# Altium schematic symbol library AliPadash.SchLib: 1186 symbols (part 2 of 6) (continued)
## DDP3315C (continued)
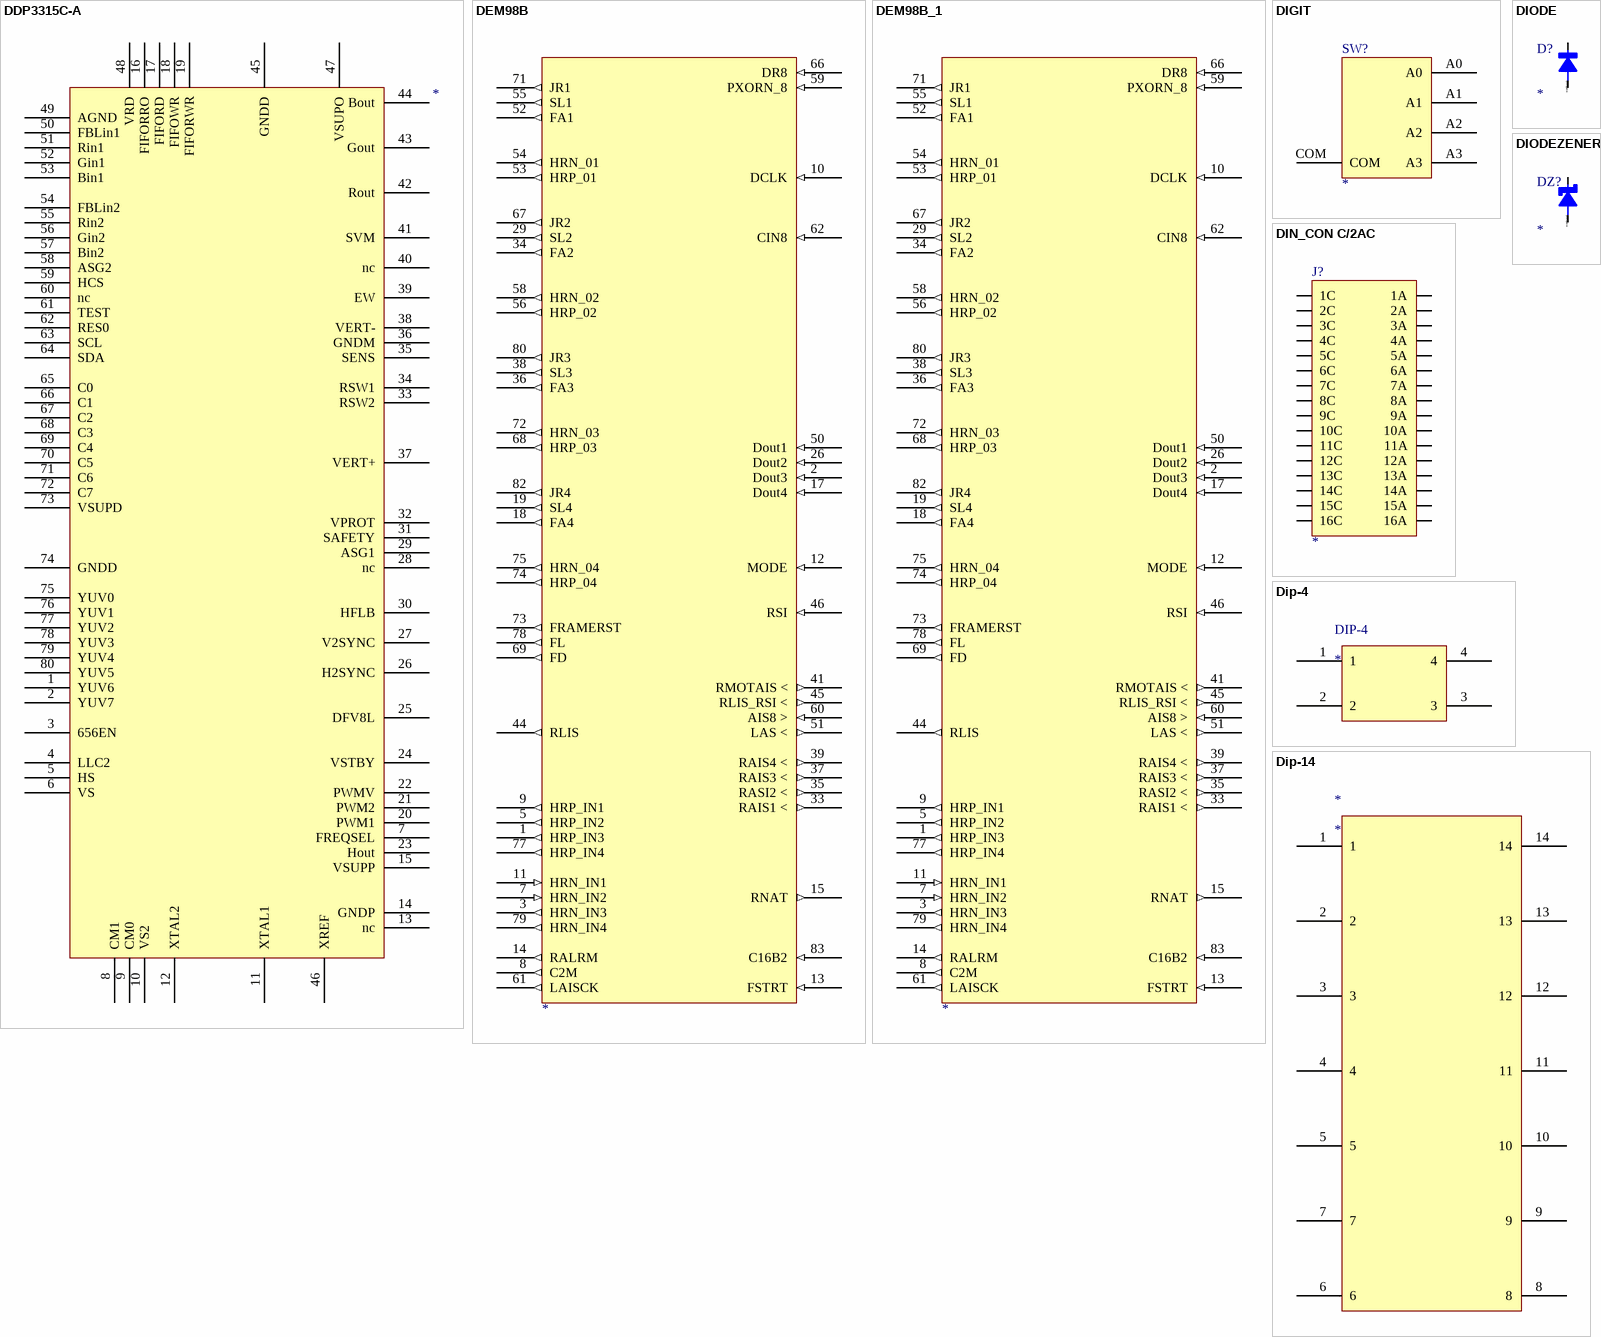
[diagram p23: symbols DDP3315C-A to Dip-14]

## DDP3315C-A
designator ?
U?
footprint PQFP80
pins: 1 YUV6, 2 YUV7, 3 656EN, 4 LLC2, 5 HS, 6 VS, 7 FREQSEL, 8 CM1, 9 CM0, 10 VS2, 11 XTAL1, 12 XTAL2, 13 nc, 14 GNDP, 15 VSUPP, 16 FIFORRO, 17 FIFORD, 18 FIFOWR, 19 FIFORWR, 20 PWM1, 21 PWM2, 22 PWMV, 23 Hout, 24 VSTBY, 25 DFV8L, 26 H2SYNC, 27 V2SYNC, 28 nc, 29 ASG1, 30 HFLB, 31 SAFETY, 32 VPROT, 33 RSW2, 34 RSW1, 35 SENS, 36 GNDM, 37 VERT+, 38 VERT-, 39 EW, 40 nc, 41 SVM, 42 Rout, 43 Gout, 44 Bout, 45 GNDD, 46 XREF, 47 VSUPO, 48 VRD, 49 AGND, 50 FBLin1, 51 Rin1, 52 Gin1, 53 Bin1, 54 FBLin2, 55 Rin2, 56 Gin2, 57 Bin2, 58 ASG2, 59 HCS, 60 nc, 61 TEST, 62 RES0, 63 SCL, 64 SDA, 65 C0, 66 C1, 67 C2, 68 C3, 69 C4, 70 C5, 71 C6, 72 C7, 73 VSUPD, 74 GNDD, 75 YUV0, 76 YUV1, 77 YUV2, 78 YUV3, 79 YUV4, 80 YUV5

## DEM98B
designator ?
pins: 1 HRP_IN3 (out), 2 Dout3 (in), 3 HRN_IN3 (out), 5 HRP_IN2 (out), 7 HRN_IN2 (in), 8 C2M (out), 9 HRP_IN1 (out), 10 DCLK (in), 11 HRN_IN1 (in), 12 MODE (in), 13 FSTRT (in), 14 RALRM (out), 15 RNAT (out), 17 Dout4 (in), 18 FA4 (out), 19 SL4 (out), 26 Dout2 (in), 29 SL2 (out), 33 RAIS1 < (out), 34 FA2 (out), 35 RASI2 < (out), 36 FA3 (out), 37 RAIS3 < (out), 38 SL3 (out), 39 RAIS4 < (out), 41 RMOTAIS < (out), 44 RLIS (out), 45 RLIS_RSI < (out), 46 RSI (in), 50 Dout1 (in), 51 LAS < (out), 52 FA1 (out), 53 HRP_01 (out), 54 HRN_01 (out), 55 SL1 (out), 56 HRP_02 (out), 58 HRN_02 (out), 59 PXORN_8 (in), 60 AIS8 > (in), 61 LAISCK (out), 62 CIN8 (in), 66 DR8 (in), 67 JR2 (out), 68 HRP_03 (out), 69 FD (out), 71 JR1 (out), 72 HRN_03 (out), 73 FRAMERST (out), 74 HRP_04 (out), 75 HRN_04 (out), 77 HRP_IN4 (out), 78 FL (out), 79 HRN_IN4 (out), 80 JR3 (out), 82 JR4 (out), 83 C16B2 (in)

## DEM98B_1
designator ?
pins: 1 HRP_IN3 (out), 2 Dout3 (in), 3 HRN_IN3 (out), 5 HRP_IN2 (out), 7 HRN_IN2 (in), 8 C2M (out), 9 HRP_IN1 (out), 10 DCLK (in), 11 HRN_IN1 (in), 12 MODE (in), 13 FSTRT (in), 14 RALRM (out), 15 RNAT (out), 17 Dout4 (in), 18 FA4 (out), 19 SL4 (out), 26 Dout2 (in), 29 SL2 (out), 33 RAIS1 < (out), 34 FA2 (out), 35 RASI2 < (out), 36 FA3 (out), 37 RAIS3 < (out), 38 SL3 (out), 39 RAIS4 < (out), 41 RMOTAIS < (out), 44 RLIS (out), 45 RLIS_RSI < (out), 46 RSI (in), 50 Dout1 (in), 51 LAS < (out), 52 FA1 (out), 53 HRP_01 (out), 54 HRN_01 (out), 55 SL1 (out), 56 HRP_02 (out), 58 HRN_02 (out), 59 PXORN_8 (in), 60 AIS8 > (in), 61 LAISCK (out), 62 CIN8 (in), 66 DR8 (in), 67 JR2 (out), 68 HRP_03 (out), 69 FD (out), 71 JR1 (out), 72 HRN_03 (out), 73 FRAMERST (out), 74 HRP_04 (out), 75 HRN_04 (out), 77 HRP_IN4 (out), 78 FL (out), 79 HRN_IN4 (out), 80 JR3 (out), 82 JR4 (out), 83 C16B2 (in)

## DIGIT
designator SW?
footprint FR01
pins: A0, A1, A2, A3, COM

## DIN_CON C/2AC
designator J?
footprint DIN32
footprint DIN32RA
pins: 1A, 1C, 2A, 2C, 3A, 3C, 4A, 4C, 5A, 5C, 6A, 6C, 7A, 7C, 8A, 8C, 9A, 9C, 10A, 10C, 11A, 11C, 12A, 12C, 13A, 13C, 14A, 14C, 15A, 15C, 16A, 16C

## DIODE
designator D?
JLCPCB: *; ManufacturerName: *
footprint DIODE0.4
footprint DIODE0.3
footprint SMD-DIODE
pins: A, K
text: @DesignPCB

## DIODEZENER
designator DZ?
JLC: *; MFAC: *
pins: A, K
text: @DesignPCB

## Dip-4
designator DIP-4
pins: 1, 2, 3, 4

## Dip-14
designator *
pins: 1, 2, 3, 4, 5, 6, 7, 8, 9, 10, 11, 12, 13, 14

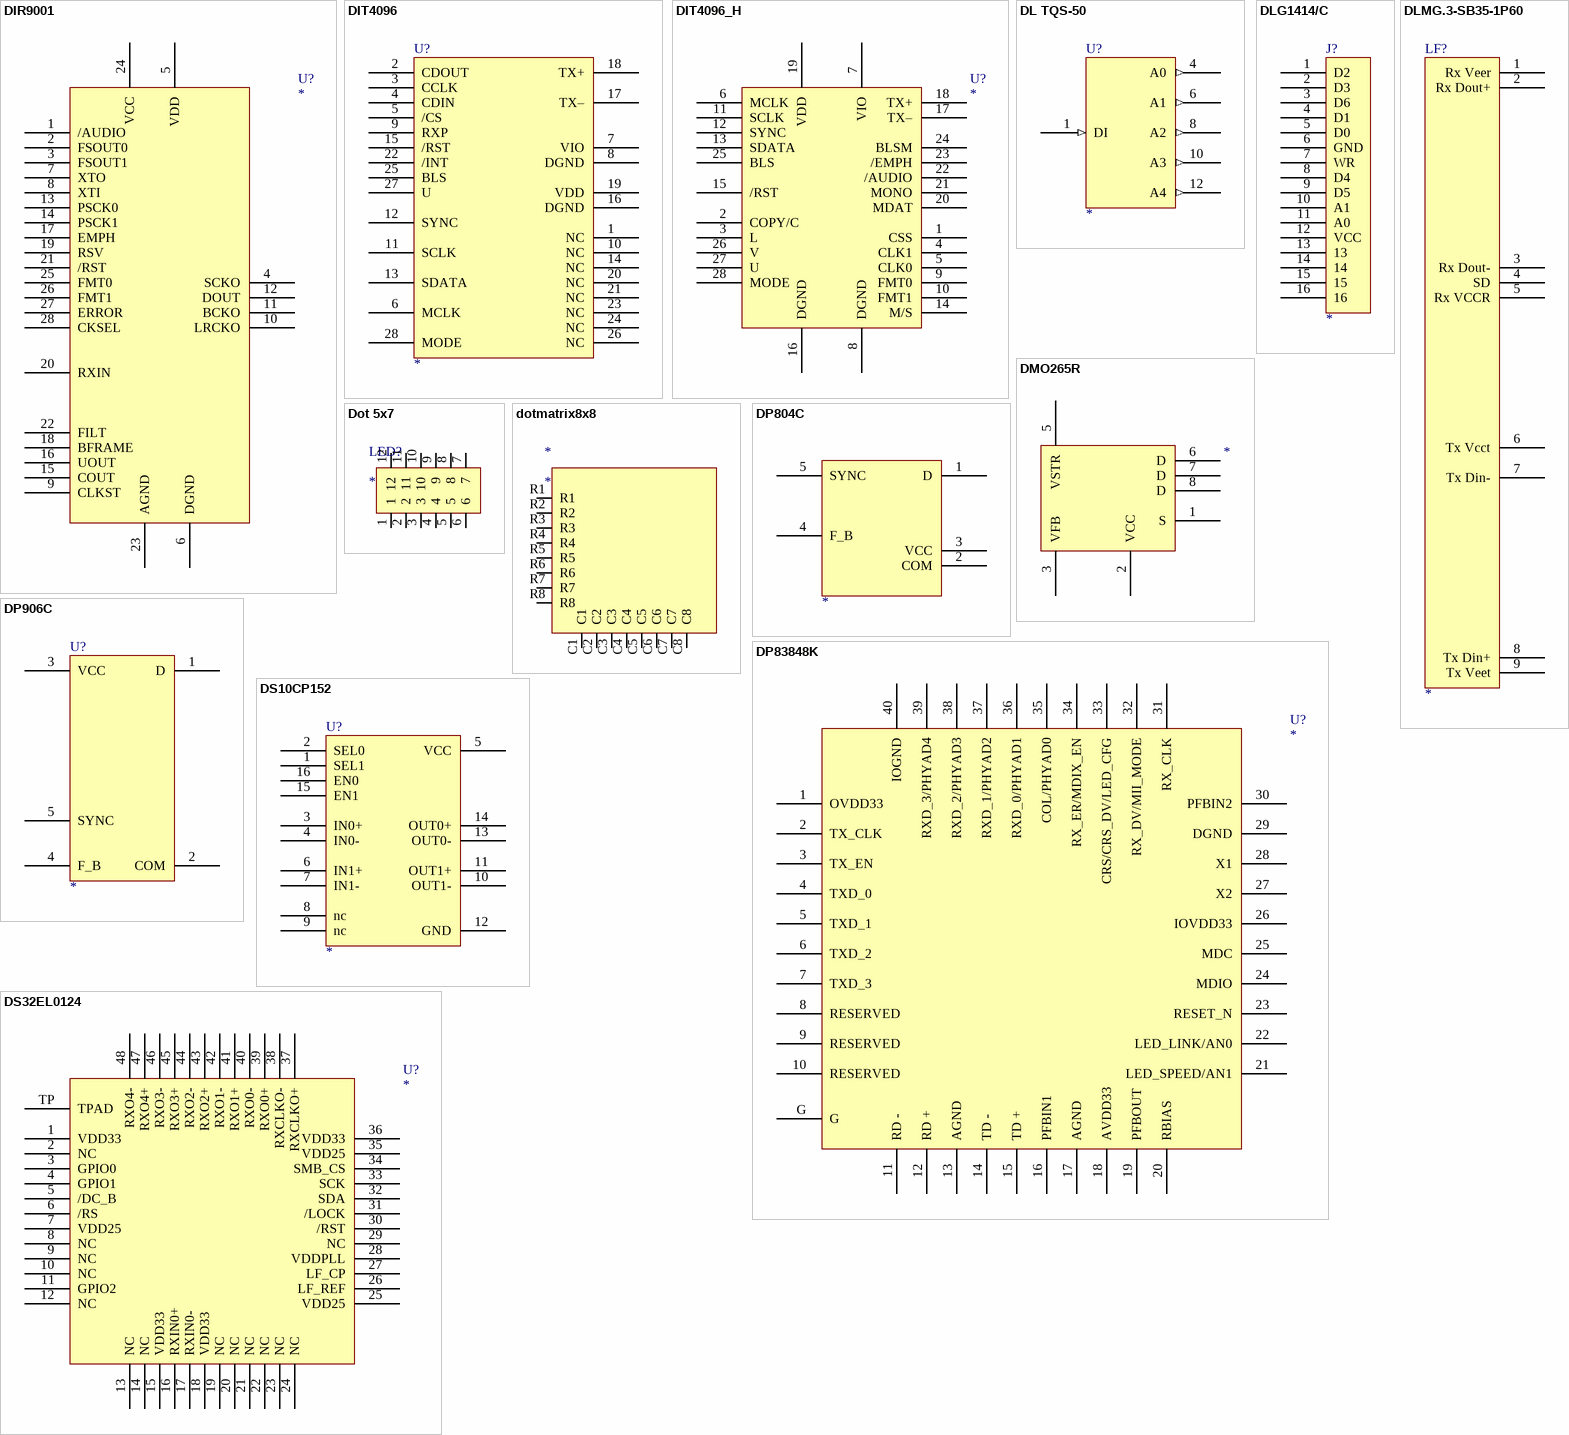
[diagram p24: symbols DIR9001 to DS32EL0124]

## DIR9001
designator U?
footprint SOP28
pins: 1 /AUDIO, 2 FSOUT0, 3 FSOUT1, 4 SCKO, 5 VDD, 6 DGND, 7 XTO, 8 XTI, 9 CLKST, 10 LRCKO, 11 BCKO, 12 DOUT, 13 PSCK0, 14 PSCK1, 15 COUT, 16 UOUT, 17 EMPH, 18 BFRAME, 19 RSV, 20 RXIN, 21 /RST, 22 FILT, 23 AGND, 24 VCC, 25 FMT0, 26 FMT1, 27 ERROR, 28 CKSEL

## DIT4096
designator U?
footprint SOP28
pins: 1 NC, 2 CDOUT, 3 CCLK, 4 CDIN, 5 /CS, 6 MCLK, 7 VIO, 8 DGND, 9 RXP, 10 NC, 11 SCLK, 12 SYNC, 13 SDATA, 14 NC, 15 /RST, 16 DGND, 17 TX–, 18 TX+, 19 VDD, 20 NC, 21 NC, 22 /INT, 23 NC, 24 NC, 25 BLS, 26 NC, 27 U, 28 MODE

## DIT4096_H
designator U?
footprint SOP28
pins: 1 CSS, 2 COPY/C, 3 L, 4 CLK1, 5 CLK0, 6 MCLK, 7 VIO, 8 DGND, 9 FMT0, 10 FMT1, 11 SCLK, 12 SYNC, 13 SDATA, 14 M/S, 15 /RST, 16 DGND, 17 TX–, 18 TX+, 19 VDD, 20 MDAT, 21 MONO, 22 /AUDIO, 23 /EMPH, 24 BLSM, 25 BLS, 26 V, 27 U, 28 MODE

## DL TQS-50
designator U?
pins: 1 DI (in), 4 A0 (out), 6 A1 (out), 7 GND (power) hidden to GND, 8 A2 (out), 10 A3 (out), 12 A4 (out), 14 VCC (power) hidden to VCC

## DLG1414/C
designator J?
pins: 1 D2, 2 D3, 3 D6, 4 D1, 5 D0, 6 GND, 7 WR, 8 D4, 9 D5, 10 A1, 11 A0, 12 VCC, 13, 14, 15, 16

## DLMG.3-SB35-1P60
designator LF?
footprint LTR01
pins: 1 Rx Veer, 2 Rx Dout+, 3 Rx Dout-, 4 SD, 5 Rx VCCR, 6 Tx Vcct, 7 Tx Din-, 8 Tx Din+, 9 Tx Veet

## DMO265R
designator ?
pins: 1 S, 2 VCC, 3 VFB, 5 VSTR, 6 D, 7 D, 8 D

## Dot 5x7
designator LED?
footprint Dot 5x7
pins: 1, 2, 3, 4, 5, 6, 7, 8, 9, 10, 11, 12

## dotmatrix8x8
designator *
footprint LEDDOTMATRIX8X8
pins: C1, C2, C3, C4, C5, C6, C7, C8, R1, R2, R3, R4, R5, R6, R7, R8

## DP804C
designator ?
pins: 1 D, 2 COM, 3 VCC, 4 F_B, 5 SYNC

## DP906C
designator U?
pins: 1 D, 2 COM, 3 VCC, 4 F_B, 5 SYNC

## DP83848K
designator U?
footprint Q40
pins: 1 OVDD33, 2 TX_CLK, 3 TX_EN, 4 TXD_0, 5 TXD_1, 6 TXD_2, 7 TXD_3, 8 RESERVED, 9 RESERVED, 10 RESERVED, 11 RD -, 12 RD +, 13 AGND, 14 TD -, 15 TD +, 16 PFBIN1, 17 AGND, 18 AVDD33, 19 PFBOUT, 20 RBIAS, 21 LED_SPEED/AN1, 22 LED_LINK/AN0, 23 RESET_N, 24 MDIO, 25 MDC, 26 IOVDD33, 27 X2, 28 X1, 29 DGND, 30 PFBIN2, 31 RX_CLK, 32 RX_DV/MII_MODE, 33 CRS/CRS_DV/LED_CFG, 34 RX_ER/MDIX_EN, 35 COL/PHYAD0, 36 RXD_0/PHYAD1, 37 RXD_1/PHYAD2, 38 RXD_2/PHYAD3, 39 RXD_3/PHYAD4, 40 IOGND, G

## DS10CP152
designator U?
footprint SO-16
pins: 1 SEL1, 2 SEL0, 3 IN0+, 4 IN0-, 5 VCC, 6 IN1+, 7 IN1-, 8 nc, 9 nc, 10 OUT1-, 11 OUT1+, 12 GND, 13 OUT0-, 14 OUT0+, 15 EN1, 16 EN0

## DS32EL0124
designator U?
footprint LLP48
pins: 1 VDD33, 2 NC, 3 GPIO0, 4 GPIO1, 5 /DC_B, 6 /RS, 7 VDD25, 8 NC, 9 NC, 10 NC, 11 GPIO2, 12 NC, 13 NC, 14 NC, 15 VDD33, 16 RXIN0+, 17 RXIN0-, 18 VDD33, 19 NC, 20 NC, 21 NC, 22 NC, 23 NC, 24 NC, 25 VDD25, 26 LF_REF, 27 LF_CP, 28 VDDPLL, 29 NC, 30 /RST, 31 /LOCK, 32 SDA, 33 SCK, 34 SMB_CS, 35 VDD25, 36 VDD33, 37 RXCLKO+, 38 RXCLKO-, 39 RXO0+, 40 RXO0-, 41 RXO1+, 42 RXO1-, 43 RXO2+, 44 RXO2-, 45 RXO3+, 46 RXO3-, 47 RXO4+, 48 RXO4-, TP TPAD

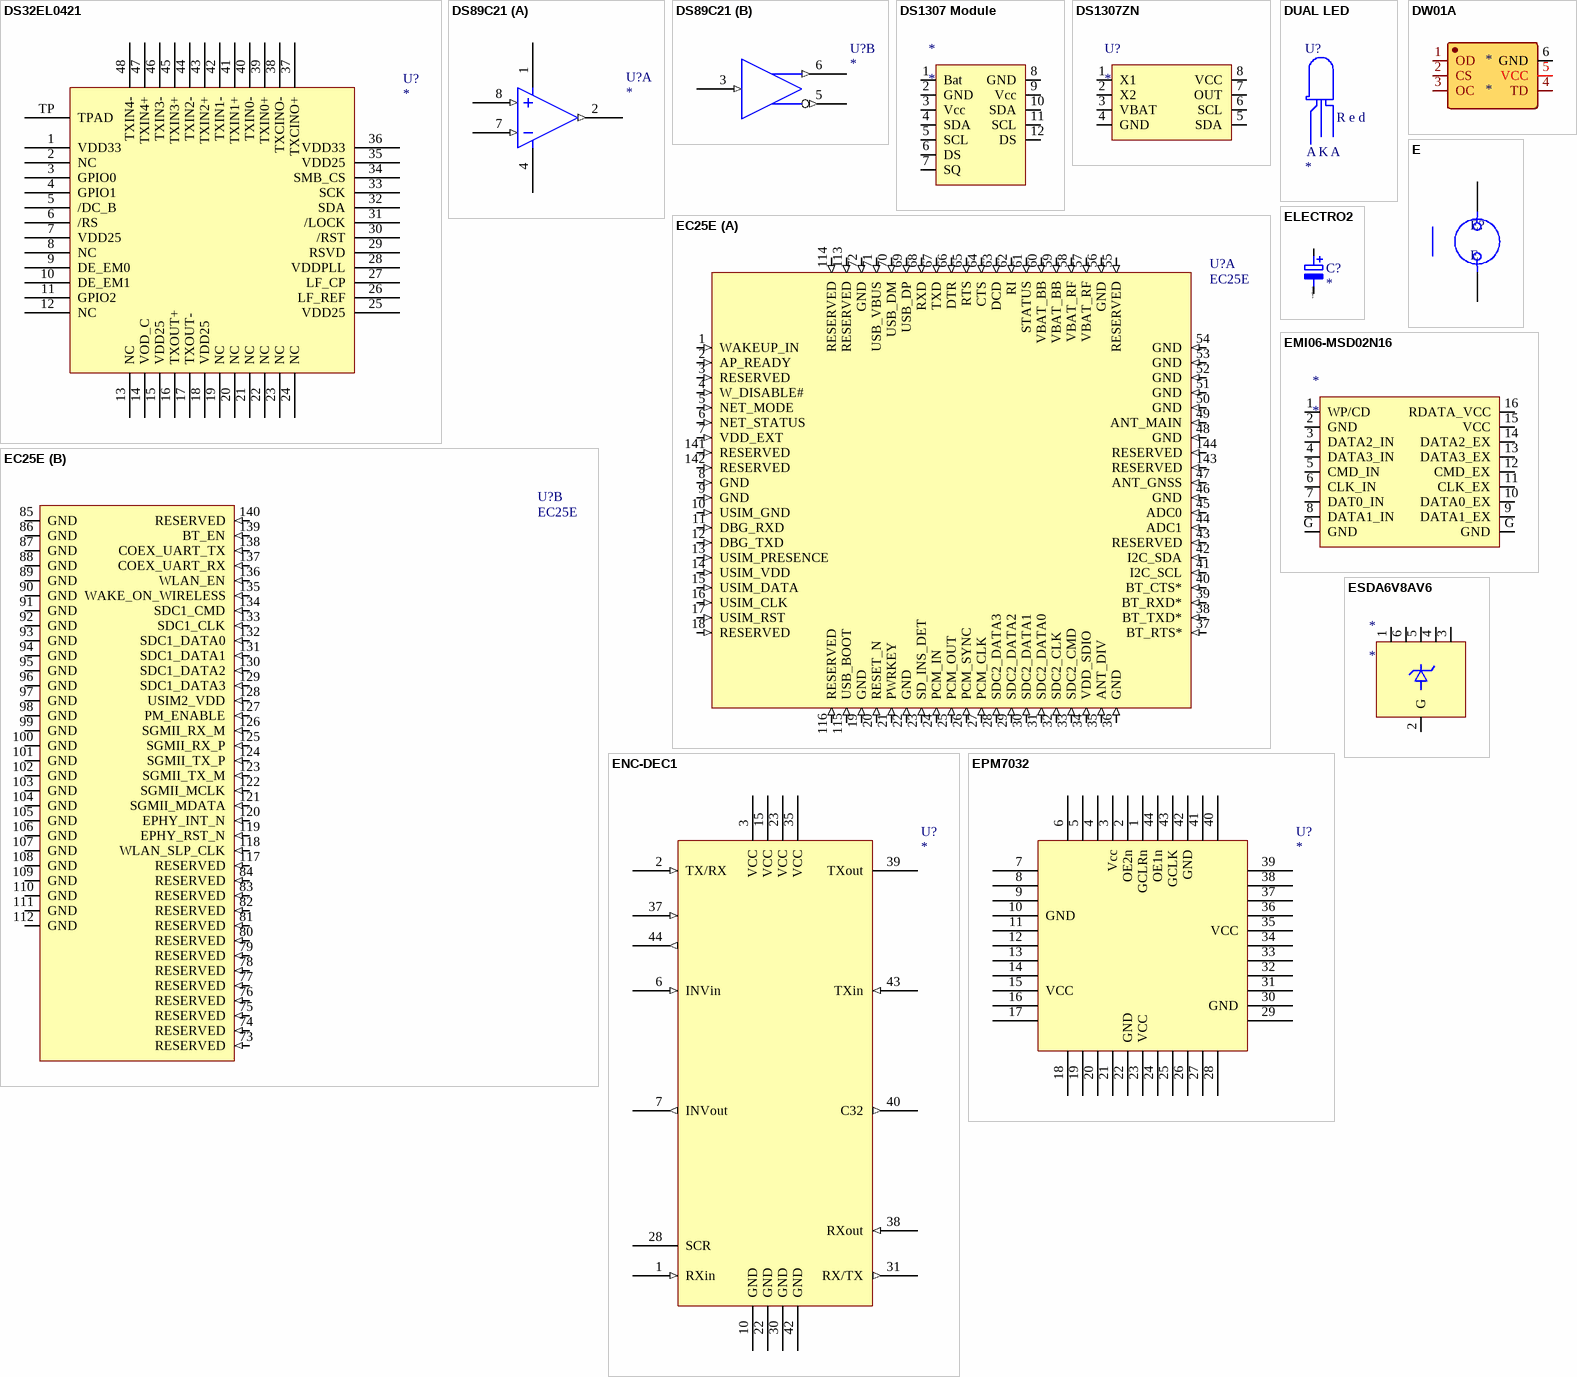
[diagram p25: symbols DS32EL0421 to ESDA6V8AV6]

## DS32EL0421
designator U?
footprint LLP48
pins: 1 VDD33, 2 NC, 3 GPIO0, 4 GPIO1, 5 /DC_B, 6 /RS, 7 VDD25, 8 NC, 9 DE_EM0, 10 DE_EM1, 11 GPIO2, 12 NC, 13 NC, 14 VOD_C, 15 VDD25, 16 TXOUT+, 17 TXOUT-, 18 VDD25, 19 NC, 20 NC, 21 NC, 22 NC, 23 NC, 24 NC, 25 VDD25, 26 LF_REF, 27 LF_CP, 28 VDDPLL, 29 RSVD, 30 /RST, 31 /LOCK, 32 SDA, 33 SCK, 34 SMB_CS, 35 VDD25, 36 VDD33, 37 TXCINO+, 38 TXCINO-, 39 TXIN0+, 40 TXIN0-, 41 TXIN1+, 42 TXIN1-, 43 TXIN2+, 44 TXIN2-, 45 TXIN3+, 46 TXIN3-, 47 TXIN4+, 48 TXIN4-, TP TPAD

## DS89C21
designator U?
footprint SO-8
part A pins: 1 V+, 2 D1 (out), 4 V-, 7 Q2 (in), 8 Q1 (in)
part B pins: 3 Q1 (in), 5 D1 (out), 6 D1 (out)

## DS1307 Module
designator *
footprint DS1307Module (Footprint not found)
pins: 1 Bat, 2 GND, 3 Vcc, 4 SDA, 5 SCL, 6 DS, 7 SQ, 8 GND, 9 Vcc, 10 SDA, 11 SCL, 12 DS

## DS1307ZN
designator U?
footprint SO-8-B2
pins: 1 X1, 2 X2, 3 VBAT, 4 GND, 5 SDA, 6 SCL, 7 OUT, 8 VCC

## DUAL LED
designator U?
text: R e d; A; K

## DW01A
designator *
footprint SOT-23-6L
pins: 1 OD, 2 CS, 3 OC, 4 TD, 5 VCC, 6 GND

## E
designator E?
pins: 1, 2

## EC25E
designator U?
footprint EC25-E
part A pins: 1 WAKEUP_IN (in), 2 AP_READY (in), 3 RESERVED (in), 4 W_DISABLE# (in), 5 NET_MODE (in), 6 NET_STATUS (in), 7 VDD_EXT (in), 8 GND (in), 9 GND (in), 10 USIM_GND (in), 11 DBG_RXD (in), 12 DBG_TXD (in), 13 USIM_PRESENCE (in), 14 USIM_VDD (in), 15 USIM_DATA (in), 16 USIM_CLK (in), 17 USIM_RST (in), 18 RESERVED (in), 19 GND (in), 20 RESET_N (in), 21 PWRKEY (in), 22 GND (in), 23 SD_INS_DET (in), 24 PCM_IN (in), 25 PCM_OUT (in), 26 PCM_SYNC (in), 27 PCM_CLK (in), 28 SDC2_DATA3 (in), 29 SDC2_DATA2 (in), 30 SDC2_DATA1 (in), 31 SDC2_DATA0 (in), 32 SDC2_CLK (in), 33 SDC2_CMD (in), 34 VDD_SDIO (in), 35 ANT_DIV (in), 36 GND (in), 37 BT_RTS* (in), 38 BT_TXD* (in), 39 BT_RXD* (in), 40 BT_CTS* (in), 41 I2C_SCL (in), 42 I2C_SDA (in), 43 RESERVED (in), 44 ADC1 (in), 45 ADC0 (in), 46 GND (in), 47 ANT_GNSS (in), 48 GND (in), 49 ANT_MAIN (in), 50 GND (in), 51 GND (in), 52 GND (in), 53 GND (in), 54 GND (in), 55 RESERVED (in), 56 GND (in), 57 VBAT_RF (in), 58 VBAT_RF (in), 59 VBAT_BB (in), 60 VBAT_BB (in), 61 STATUS (in), 62 RI (in), 63 DCD (in), 64 CTS (in), 65 RTS (in), 66 DTR (in), 67 TXD (in), 68 RXD (in), 69 USB_DP (in), 70 USB_DM (in), 71 USB_VBUS (in), 72 GND (in), 113 RESERVED (in), 114 RESERVED (in), 115 USB_BOOT (in), 116 RESERVED (in), 141 RESERVED (in), 142 RESERVED (in), 143 RESERVED (in), 144 RESERVED (in)
part B pins: 73 RESERVED (in), 74 RESERVED (in), 75 RESERVED (in), 76 RESERVED (in), 77 RESERVED (in), 78 RESERVED (in), 79 RESERVED (in), 80 RESERVED (in), 81 RESERVED (in), 82 RESERVED (in), 83 RESERVED (in), 84 RESERVED (in), 85 GND (power), 86 GND (power), 87 GND (power), 88 GND (power), 89 GND (power), 90 GND (power), 91 GND (power), 92 GND (power), 93 GND (power), 94 GND (power), 95 GND (power), 96 GND (power), 97 GND (power), 98 GND (power), 99 GND (power), 100 GND (power), 101 GND (power), 102 GND (power), 103 GND (power), 104 GND (power), 105 GND (power), 106 GND (power), 107 GND (power), 108 GND (power), 109 GND (power), 110 GND (power), 111 GND (power), 112 GND (power), 117 RESERVED (in), 118 WLAN_SLP_CLK (in), 119 EPHY_RST_N (in), 120 EPHY_INT_N (in), 121 SGMII_MDATA (in), 122 SGMII_MCLK (in), 123 SGMII_TX_M (in), 124 SGMII_TX_P (in), 125 SGMII_RX_P (in), 126 SGMII_RX_M (in), 127 PM_ENABLE (in), 128 USIM2_VDD (in), 129 SDC1_DATA3 (in), 130 SDC1_DATA2 (in), 131 SDC1_DATA1 (in), 132 SDC1_DATA0 (in), 133 SDC1_CLK (in), 134 SDC1_CMD (in), 135 WAKE_ON_WIRELESS (in), 136 WLAN_EN (in), 137 COEX_UART_RX (in), 138 COEX_UART_TX (in), 139 BT_EN (in), 140 RESERVED (in)

## ELECTRO2
designator C?
JLCPCB: *; ManufacturerName: *
footprint RB.1/.15A
footprint RB.1/.2
footprint RB.1/.25
footprint RB.1/.3
pins: 1, 2
text: @DesignPCB

## EMI06-MSD02N16
designator *
footprint QFN3.5x1.2-16L
pins: 1 WP/CD, 2 GND, 3 DATA2_IN, 4 DATA3_IN, 5 CMD_IN, 6 CLK_IN, 7 DAT0_IN, 8 DATA1_IN, 9 DATA1_EX, 10 DATA0_EX, 11 CLK_EX, 12 CMD_EX, 13 DATA3_EX, 14 DATA2_EX, 15 VCC, 16 RDATA_VCC, G GND, G GND

## ENC-DEC1
designator U?
pins: 1 RXin (in), 2 TX/RX (in), 3 VCC, 6 INVin (in), 7 INVout (out), 10 GND, 15 VCC, 22 GND, 23 VCC, 28 SCR, 30 GND, 31 RX/TX (out), 35 VCC, 37 (in), 38 RXout (in), 39 TXout, 40 C32 (out), 42 GND, 43 TXin (in), 44 (out)

## EPM7032
designator U?
footprint PGA44X8
pins: 1 GCLRn, 2 OE2n, 3 Vcc, 4, 5, 6, 7, 8, 9, 10 GND, 11, 12, 13, 14, 15 VCC, 16, 17, 18, 19, 20, 21, 22 GND, 23 VCC, 24, 25, 26, 27, 28, 29, 30 GND, 31, 32, 33, 34, 35 VCC, 36, 37, 38, 39, 40, 41, 42 GND, 43 GCLK, 44 OE1n

## ESDA6V8AV6
designator *
footprint SOT-563
pins: 1, 2 G, 3, 4, 5, 6

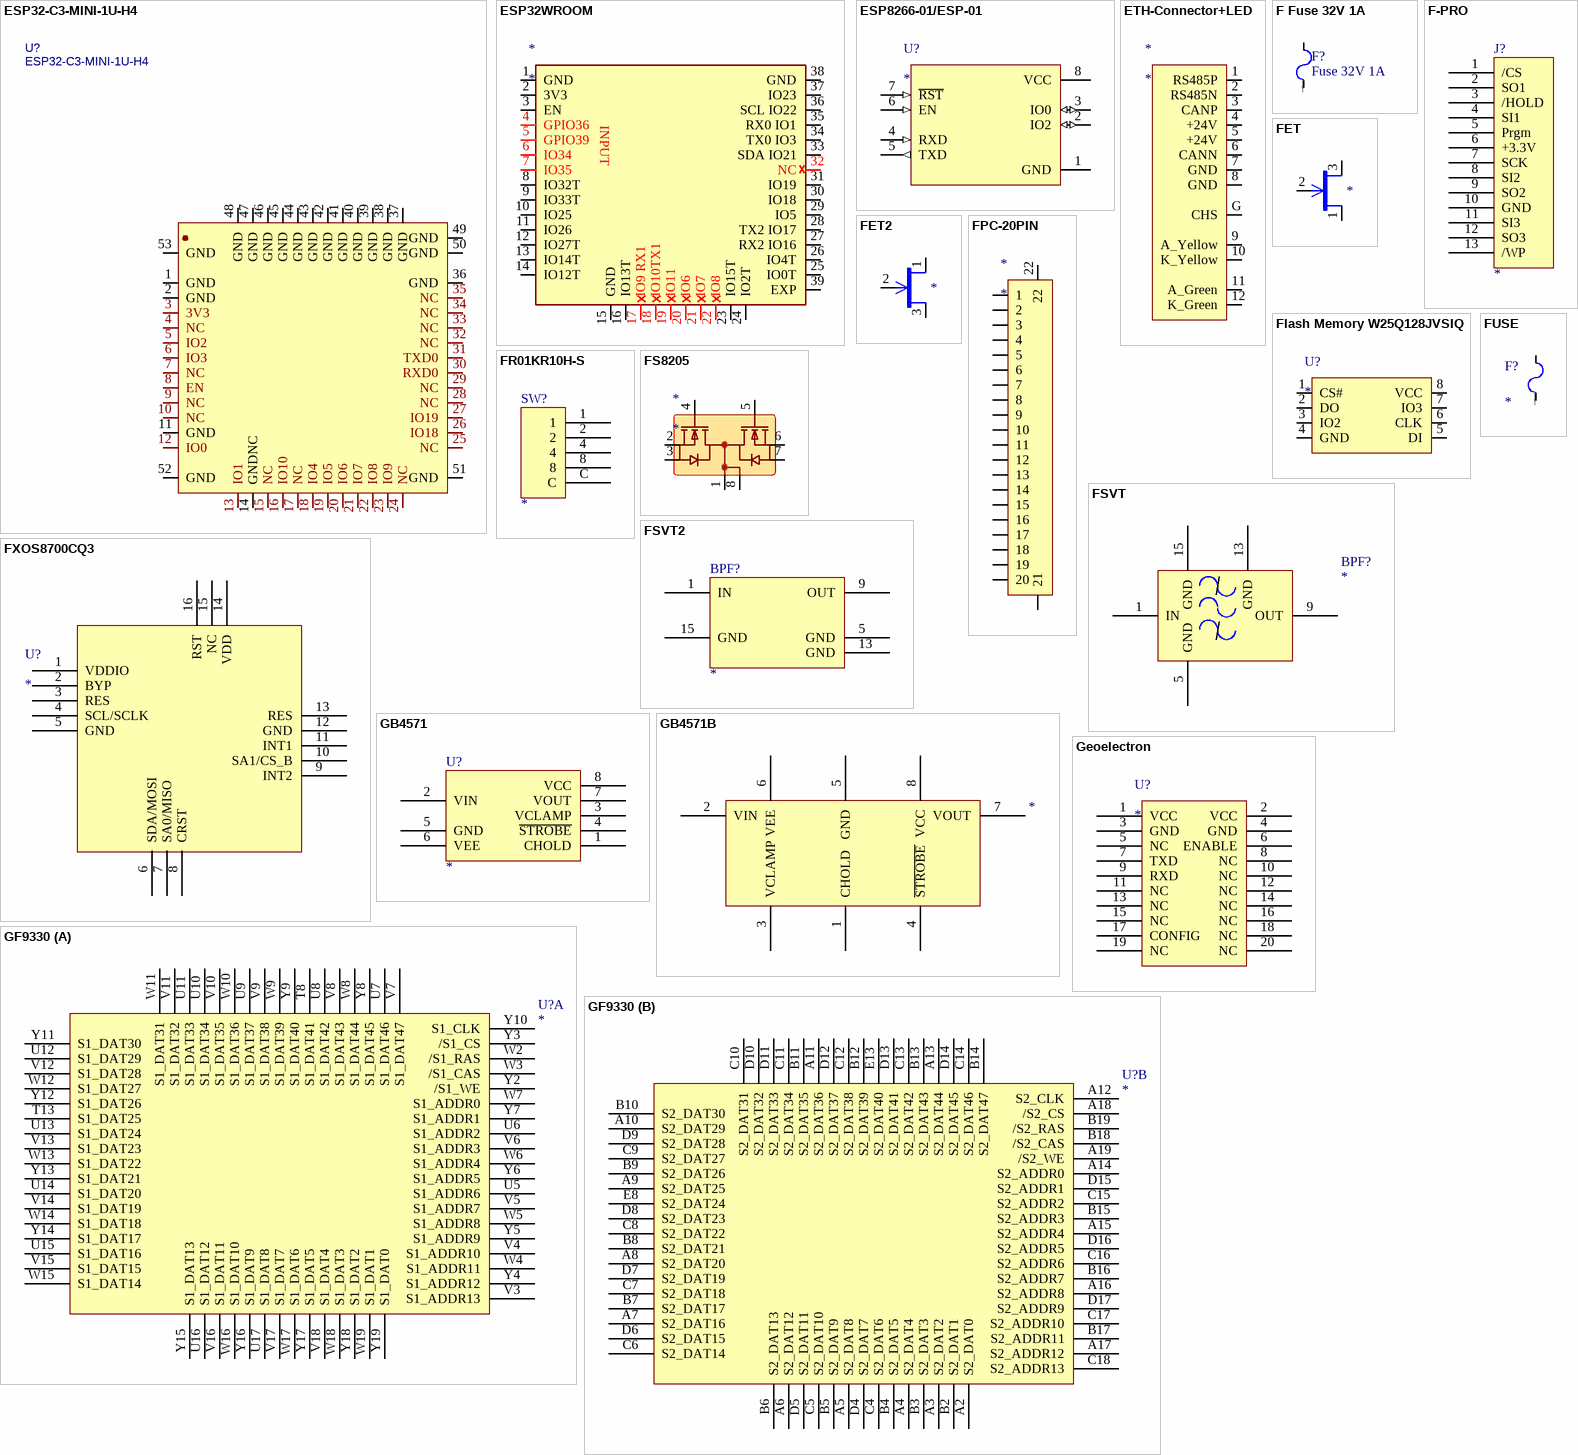
[diagram p26: symbols ESP32-C3-MINI-1U-H4 to GF9330]

## ESP32-C3-MINI-1U-H4
designator U?
MAFC: ESP32-C3-MINI-1U-H4; JLC: C3013922
footprint WIFIM-SMD_ESP32-C3-MINI-MINI-1U (Footprint not found)
pins: 1 GND, 2 GND, 3 3V3, 4 NC, 5 IO2, 6 IO3, 7 NC, 8 EN, 9 NC, 10 NC, 11 GND, 12 IO0, 13 IO1, 14 GNDNC, 15 NC, 16 IO10, 17 NC, 18 IO4, 19 IO5, 20 IO6, 21 IO7, 22 IO8, 23 IO9, 24 NC, 25 NC, 26 IO18, 27 IO19, 28 NC, 29 NC, 30 RXD0, 31 TXD0, 32 NC, 33 NC, 34 NC, 35 NC, 36 GND, 37 GND, 38 GND, 39 GND, 40 GND, 41 GND, 42 GND, 43 GND, 44 GND, 45 GND, 46 GND, 47 GND, 48 GND, 49 GND, 50 GND, 51 GND, 52 GND, 53 GND

## ESP32WROOM
designator *
footprint ESP32-WROOM-32U
pins: 1 GND (hiz), 2 3V3 (hiz), 3 EN (hiz), 4 GPIO36 (hiz), 5 GPIO39 (hiz), 6 IO34 (hiz), 7 IO35 (hiz), 8 IO32T (hiz), 9 IO33T (hiz), 10 IO25 (hiz), 11 IO26 (hiz), 12 IO27T (hiz), 13 IO14T (hiz), 14 IO12T (hiz), 15 GND (hiz), 16 IO13T (hiz), 17 IO9 RX1 (hiz), 18 IO10TX1 (hiz), 19 IO11 (hiz), 20 IO6 (hiz), 21 IO7 (hiz), 22 IO8 (hiz), 23 IO15T (hiz), 24 IO2T (hiz), 25 IO0T (hiz), 26 IO4T (hiz), 27 RX2 IO16 (hiz), 28 TX2 IO17 (hiz), 29 IO5 (hiz), 30 IO18 (hiz), 31 IO19 (hiz), 32 NC (hiz), 33 SDA IO21 (hiz), 34 TX0 IO3 (hiz), 35 RX0 IO1 (hiz), 36 SCL IO22 (hiz), 37 IO23 (hiz), 38 GND (hiz), 39 EXP (hiz)
text: INPUT

## ESP8266-01/ESP-01
designator U?
MakerFocus 4pcs ESP8266 ESP-01 Serial Wireless WiFi Transceiver Receiver Module 1MB SPI Flash DC3.0-3.6V Internet of Things WiFi Module Board Compatible with Ar duino; MP: ESP8266-01/ESP-01; Value: *; Package: None; Availability: Unavailable; Price: None
footprint XCVR_ESP8266-01/ESP-01
pins: 1 GND (power), 2 IO2 (io), 3 IO0 (io), 4 RXD (in), 5 TXD (out), 6 EN (in), 7 ~{RST} (in), 8 VCC (power)

## ETH-Connector+LED
designator *
footprint RJ45+LED1 (Footprint not found)
pins: 1 RS485P, 2 RS485N, 3 CANP, 4 +24V, 5 +24V, 6 CANN, 7 GND, 8 GND, 9 A_Yellow, 10 K_Yellow, 11 A_Green, 12 K_Green, G CHS

## F Fuse 32V 1A
designator F?, comment Fuse 32V 1A
MFAC: S1206-F-1.0A; JLC: C553921
footprint FUSE4
footprint FUSE3
footprint 1206
footprint 1206
pins: 1, 2
text: @DesignPCB

## F-PRO
designator J?
footprint CON13/CON
pins: 1 /CS, 2 SO1, 3 /HOLD, 4 SI1, 5 Prgm, 6 +3.3V, 7 SCK, 8 SI2, 9 SO2, 10 GND, 11 SI3, 12 SO3, 13 /WP

## FET
designator ?
pins: 1, 2, 3

## FET2
designator ?
pins: 1, 2, 3

## Flash Memory W25Q128JVSIQ
designator U?
MFAC: W25Q128JVSIQ; JLC: C97521
footprint SOIC-8_L5.3-W5.3-P1.27-LS8.0-BL (Footprint not found)
pins: 1 CS#, 2 DO, 3 IO2, 4 GND, 5 DI, 6 CLK, 7 IO3, 8 VCC

## FPC-20PIN
designator *
MFAC: AFC07-S20ECA-00; JLC: C262641
footprint FPC_0.5MM _20PIN
pins: 1, 2, 3, 4, 5, 6, 7, 8, 9, 10, 11, 12, 13, 14, 15, 16, 17, 18, 19, 20, 21, 22

## FR01KR10H-S
designator SW?
pins: 1, 2, 4, 8, C

## FS8205
designator *
footprint TSSOP8
pins: 1 D12, 2 S1, 3 S1, 4 G1, 5 G2, 6 S2, 7 S2, 8 D12

## FSVT
designator BPF?
footprint BPF1
pins: 1 IN, 5 GND, 9 OUT, 13 GND, 15 GND

## FSVT2
designator BPF?
footprint BPF2
footprint BPF1
pins: 1 IN, 5 GND, 9 OUT, 13 GND, 15 GND

## FUSE
designator F?
footprint FUSE4
footprint FUSE3
pins: 1, 2
text: @DesignPCB

## FXOS8700CQ3
designator U?
footprint LGA16 (QFN, 16-Leads, Body 3/00x3/00mm, Pitch 0/50mm, Thermal Pad 1/00x1/00mm, IPC Medium Density)
pins: 1 VDDIO, 2 BYP, 3 RES, 4 SCL/SCLK, 5 GND, 6 SDA/MOSI, 7 SA0/MISO, 8 CRST, 9 INT2, 10 SA1/CS_B, 11 INT1, 12 GND, 13 RES, 14 VDD, 15 NC, 16 RST

## GB4571
designator U?
footprint SO-8
pins: 1 CHOLD, 2 VIN, 3 VCLAMP, 4 ~{STROBE}, 5 GND, 6 VEE, 7 VOUT, 8 VCC

## GB4571B
designator ?
pins: 1 CHOLD, 2 VIN, 3 VCLAMP, 4 ~{STROBE}, 5 GND, 6 VEE, 7 VOUT, 8 VCC

## Geoelectron
designator U?
footprint GeoElectronTRM101
pins: 1 VCC, 2 VCC, 3 GND, 4 GND, 5 NC, 6 ENABLE, 7 TXD, 8 NC, 9 RXD, 10 NC, 11 NC, 12 NC, 13 NC, 14 NC, 15 NC, 16 NC, 17 CONFIG, 18 NC, 19 NC, 20 NC

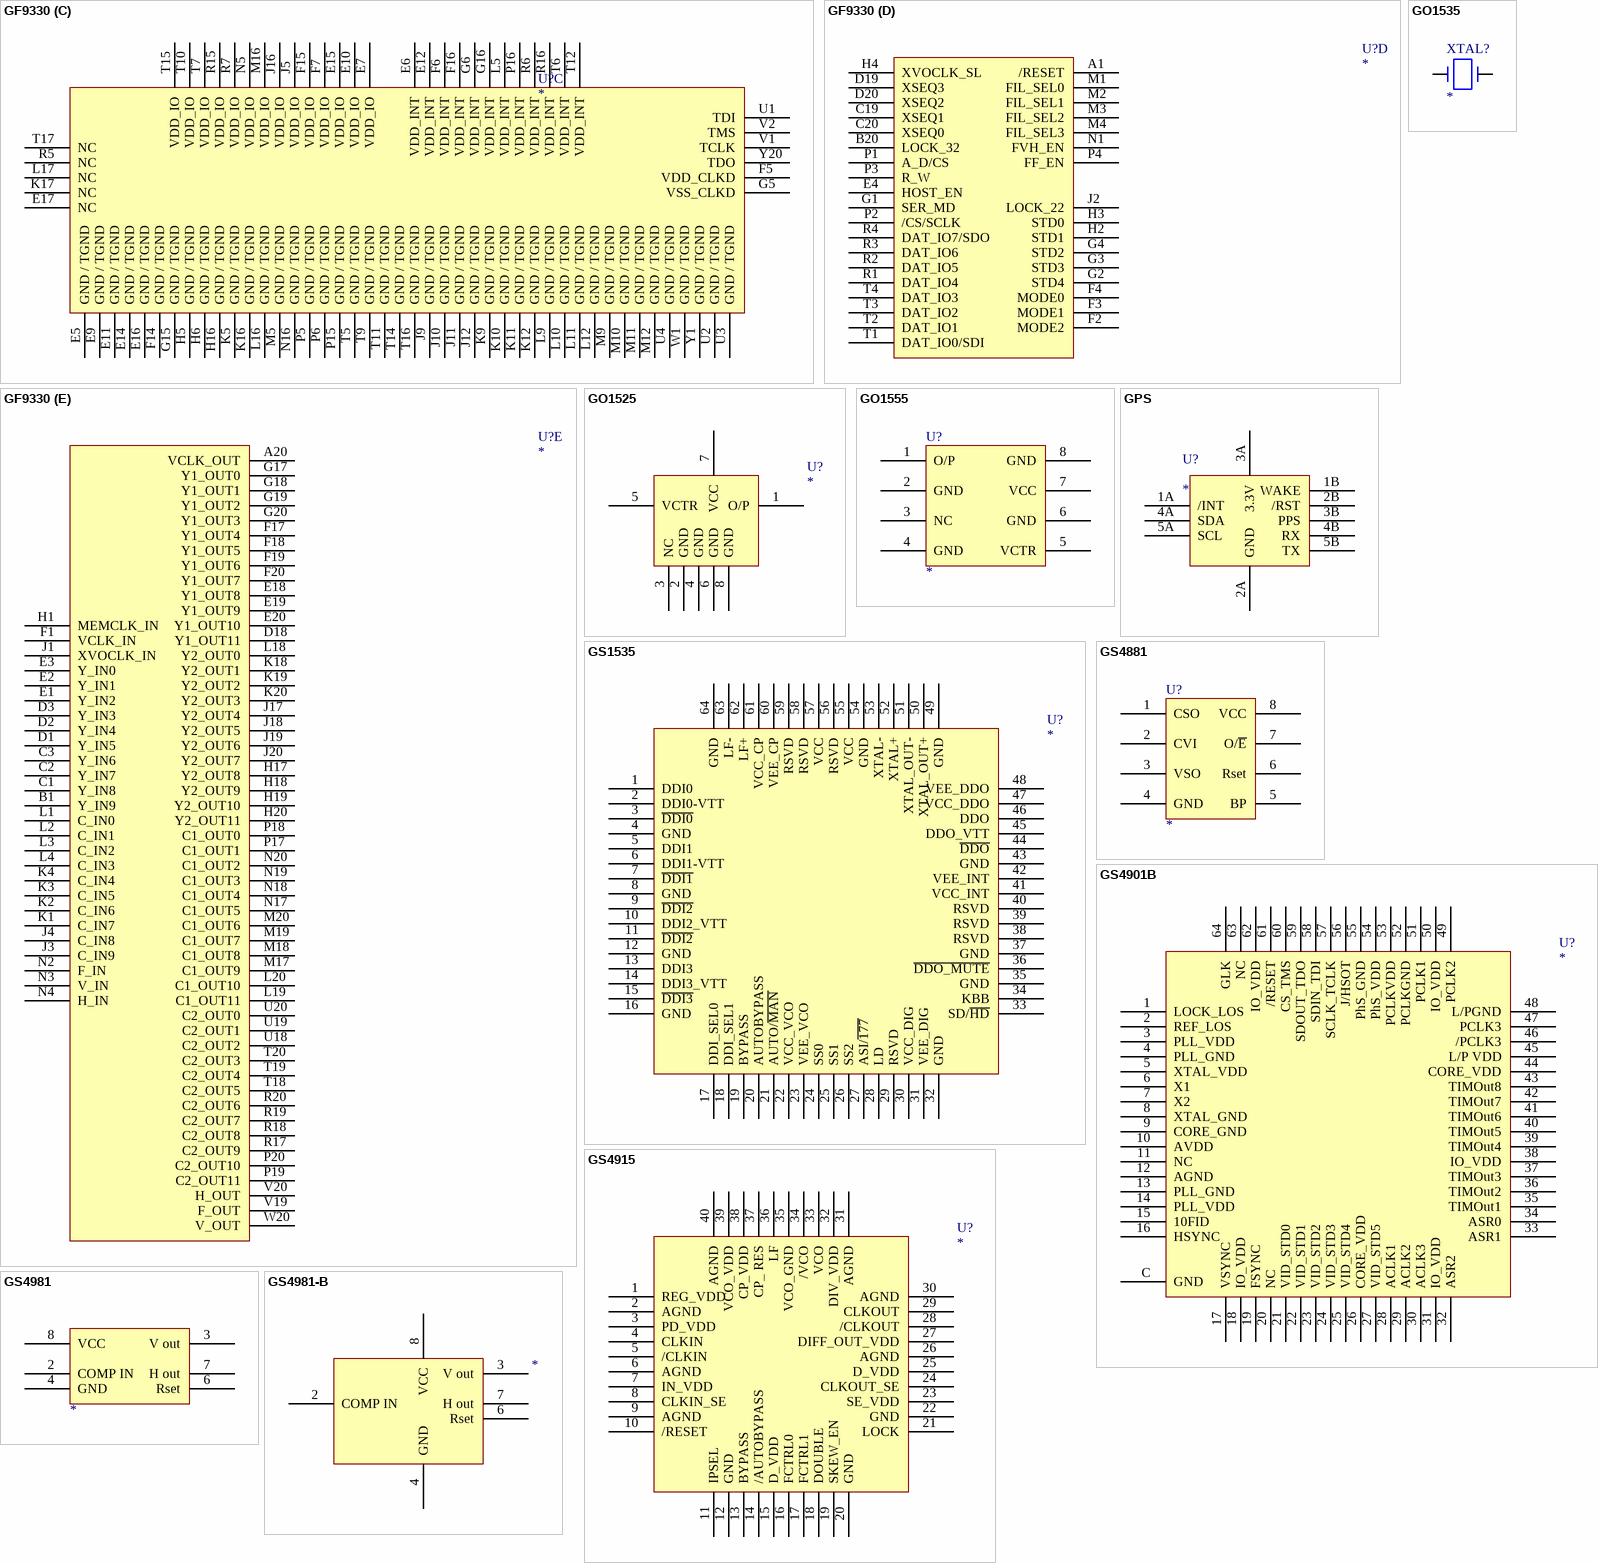
[diagram p27: symbols GF9330 to GS4981-B]